# Altium footprint library Connectors.PcbLib: 135 footprints (part 3 of 9)
Each footprint in its own frame and in the unit in brackets; x right, y up, seen from the top. Pads: shape width x height; smd on the part's side, far side on the other; paste and mask are expansions set on the pad; w line width, h text height; cw(c..) or ccw(c..) is an arc to the next point about the centre after c.
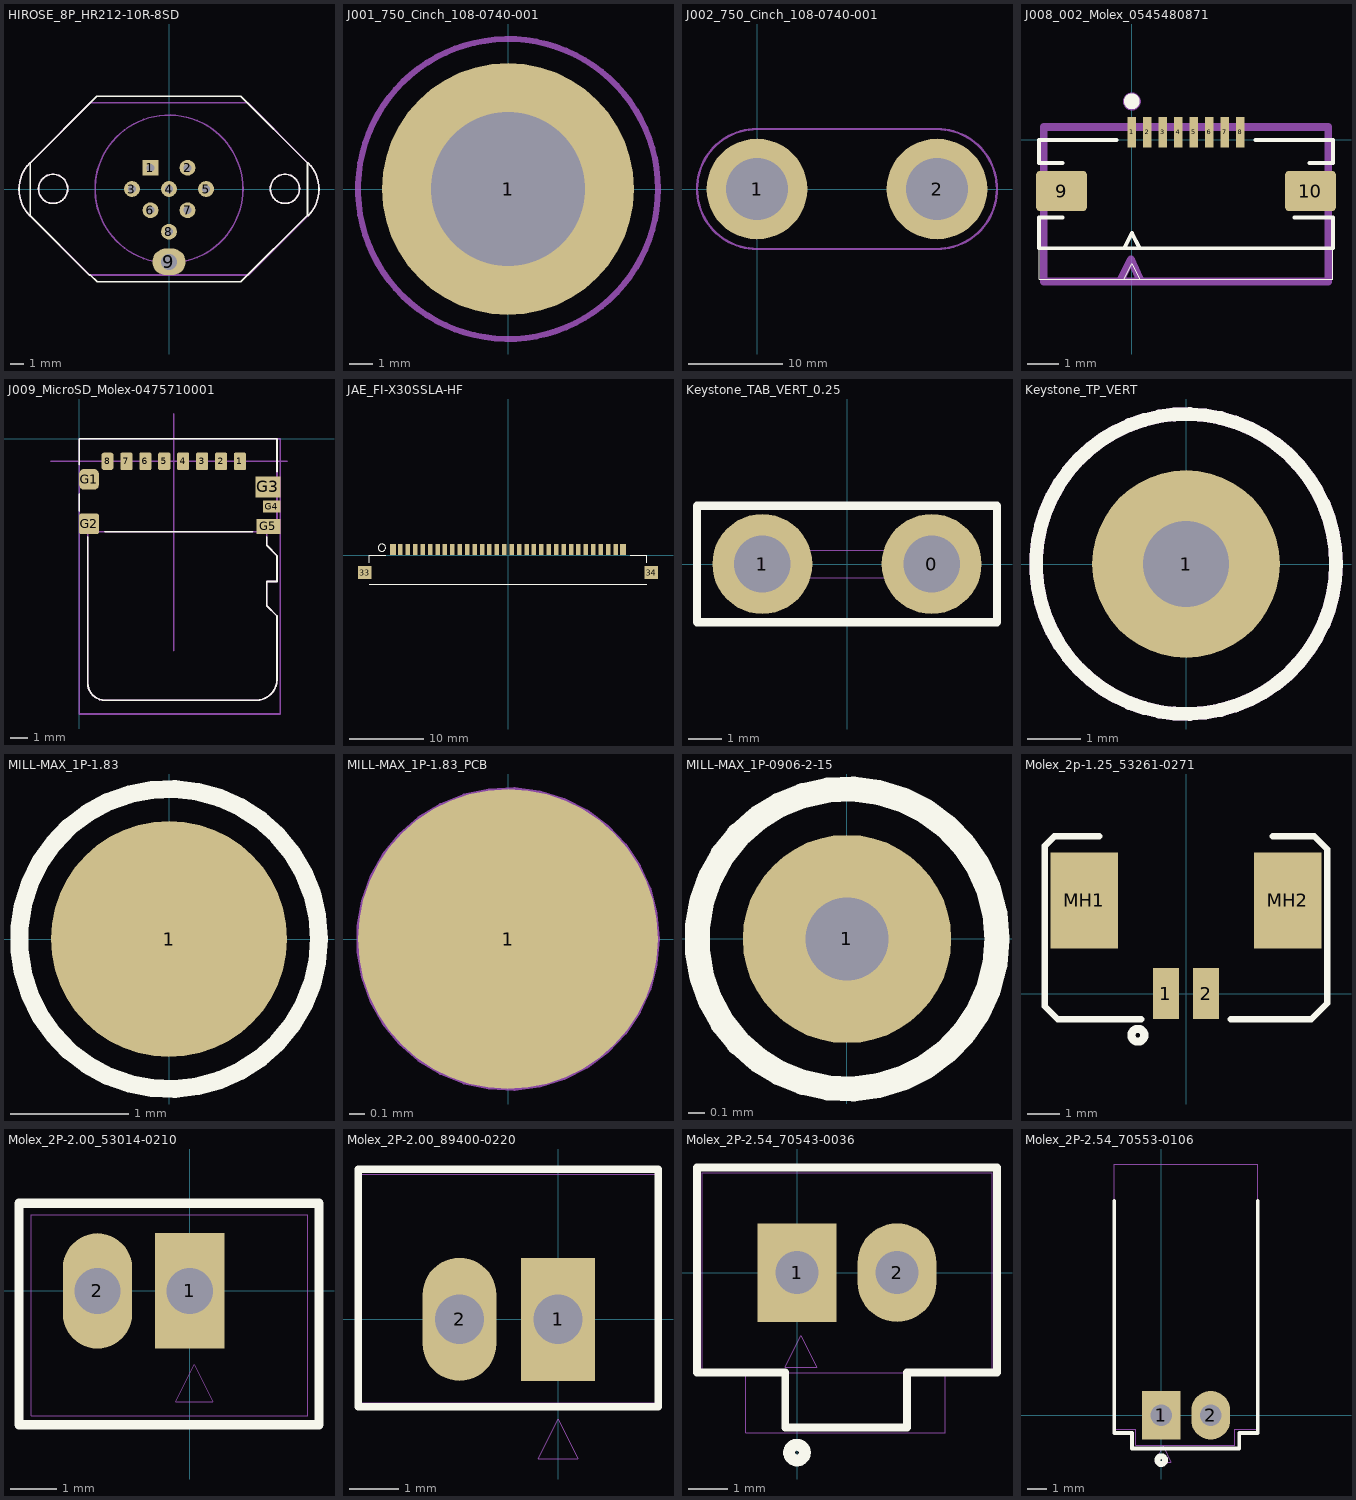
[diagram p2: the footprints below, top view; thin cyan lines are the x and y axes]

## HIROSE_8P_HR212-10R-8SD [mm] "Connector Receptacle mini-din 10 shell 8 position"
height 15.7
pads (9):
  rect 1.2x1.2 hole 0.6: 1(-1.4,1.6)
  round 1.2 hole 0.6: 2(1.4,1.6) 3(-2.794,0) 4(0,0) 5(2.8,0) 6(-1.4,-1.6) 7(1.4,-1.6) 8(0,-3.223)
  oval 2.5x2 hole 1.2: 9(0,-5.5)
Top Overlay:
  circle w0.127: c-8.749,0.012 r1.1
  circle w0.127: c8.751,0.012 r1.1
  lines w0.127: -10.496,-2.011 cw(c-8.507,-0.021) -10.496,1.968 ; 10.496,-2.011 ccw(c8.507,-0.021) 10.496,1.968 ; -10.482,-2.01 -6.007,-6.485 -5.937,-6.485 -5.422,-7 5.415,-7 10.447,-1.969 10.447,1.968 5.414,7 -5.45,7 -10.482,1.968 -10.482,-2.01
Mechanical 1:
  circle w0.127: c0,0 r5.579
  circle w0.127: c-1.399,1.612 r0.3
  circle w0.127: c-2.799,0.012 r0.3
  circle w0.127: c-1.399,-1.588 r0.3
  circle w0.127: c0.001,-5.488 r0.55
  circle w0.127: c0.001,-3.188 r0.3
  circle w0.127: c0.001,0.012 r0.3
  circle w0.127: c1.401,-1.588 r0.3
  circle w0.127: c2.801,0.012 r0.3
  circle w0.127: c1.401,1.612 r0.3
  circle w0.127: c8.751,0.012 r1.1
  circle w0.127: c-8.749,0.012 r1.1
  lines w0.127: -10.496,-2.011 cw(c-8.507,-0.021) -10.496,1.968 -10.469,1.968 -5.936,6.501 ; -10.49,-2.012 -6.024,-6.478 ; -6.014,-6.488 6.024,-6.488 ; -5.925,6.512 5.925,6.512 ; 5.936,6.501 10.469,1.968 ; 6.024,-6.478 10.49,-2.012 ; 10.496,-2.011 ccw(c8.507,-0.021) 10.496,1.968
  text ".Designator" at -0.6,2.9 h1.52
  text "1" at -2.54,2.032 h1
  text "9" at 1.404,-4.858 h1
3D body "HR212-10R-8SD.stp": height 12.7, standoff -3, extent -11.25,-6.521 11.25,6.479

## J001_750_Cinch_108-0740-001 [mil] "J001_175_Cinch_Banana-Jack"
pads (1):
  round 420 hole 257: 1(0,0)
Mechanical 1:
  circle w10: c0,0 r250

## J002_750_Cinch_108-0740-001 [mil] "J002_750_Cinch_Banana-Jack"
pads (2):
  round 420 hole 257: 1(0,0) 2(750,0)
Mechanical 1:
  lines w10: 0,-250 cw(c0,0) 0,250 750,250 cw(c750,0) 750,-250 0,-250

## J008_002_Molex_0545480871 [mm] "Connector, Header, 8pos, 0.5mm pitch, Horizontal Flat Flex"
height 1.2
pads (10):
  rrect20% 0.275x1 smd mask+0.064: 1(0,0.25) 2(0.5,0.25) 3(1,0.25) 4(1.5,0.25) 5(2,0.25) 6(2.5,0.25) 7(3,0.25) 8(3.5,0.25)
  rrect20% 1.65x1.3 smd: 9(-2.275,-1.65) 10(5.775,-1.65)
Top Overlay:
  circle w0.254: c0,1.25 r0.127
  lines w0.025: -3,-3.5 -3,-4.5 6.5,-4.5 6.5,-3.5 ; -0.25,-4.5 0,-4 0.25,-4.5
  lines w0.127: -2.25,-2.5 -3,-2.5 -3,-3.5 6.5,-3.5 6.5,-2.5 5.25,-2.5 ; -2.25,-0.75 -3,-0.75 -3,0 -0.5,0 ; -0.25,-3.5 0,-3 0.25,-3.5 ; 4,0 6.5,0 6.5,-0.75 5.75,-0.75
Mechanical 1:
  circle w0.254: c0,1.245 r0.161
  lines w0.254: -0.356,-4.496 -0.025,-3.861 0.254,-4.496 ; -2.85,-4.575 6.35,-4.575 6.35,0.425 -2.85,0.425 -2.85,-4.575
3D body "545480871.stp": height 1.18, standoff -0.02, extent -2.85,-4.575 6.35,0.425

## J009_MicroSD_Molex-0475710001 [mm] "CONN MICRO SD CARD PUSH-PULL R/A"
height 2.311
pads (13):
  rrect20% 0.7x1 smd: 1(9.35,-1.31) 2(8.25,-1.31) 3(7.15,-1.31) 4(6.05,-1.31) 5(4.95,-1.31) 6(3.85,-1.31) 7(2.75,-1.31)
  rrect40% 0.7x1 smd: 8(1.65,-1.31)
  rrect50% 1.15x1.2 smd: G1(0.575,-2.36)
  rrect20% 1.15x1.2 smd: G2(0.575,-4.95)
  rect 1.45x1.2 smd: G3(10.975,-2.8)
  rect 1x0.7 smd: G4(11.2,-3.95)
  rect 1.4x0.9 smd: G5(11,-5.1)
Top Overlay:
  lines w0.1: 0,-4.2 0,-3.2 ; 0,-1.5 0,0 11.5,0 11.5,-1.9 ; 0.5,-5.7 0.5,-14.2 ccw(c1.5,-14.2) 1.5,-15.2 10.3,-15.2 ccw(c10.3,-14) 11.5,-14 11.5,-10.3 10.9,-9.7 10.9,-8.3 11.5,-8.3 11.5,-6.8 10.9,-6.2 10.9,-5.7 ; 1.5,-5.4 10.1,-5.4
Mechanical 1:
  lines w0.1: 0.5,-5.4 0.5,-14.2 ccw(c1.5,-14.2) 1.5,-15.2 10.3,-15.2 ccw(c10.3,-14) 11.5,-14 11.5,-10.3 10.9,-9.7 10.9,-8.3 11.5,-8.3 11.5,-6.8 10.9,-6.2 10.9,-5.4 ; 0,0 0,-1.6 0,-3.1 0,-4.2 0,-5.4 1.3,-5.4 10.1,-5.4 11.5,-5.4 11.5,0 5.5,0 0,0 ; 0,0 11.7,0 11.7,-16 0,-16 0,0
Mechanical 3:
  lines w0.1: -1.65,-1.31 12.1,-1.31 ; 5.5,-12.31 5.5,1.44
3D body "475710001.stp": height 2.31, standoff 0.01, extent 0.12,-5.25 11.52,0.2

## JAE_FI-X30SSLA-HF [mm] "1.0mm pitch, for interface of LCD"
pads (34):
  rect 0.8x1.5 smd: 1(-15.5,0.75) 32(15.5,0.75)
  rect 0.6x1.5 smd: 2(-14.5,0.75) 3(-13.5,0.75) 4(-12.5,0.75) 5(-11.5,0.75) 6(-10.5,0.75) 7(-9.5,0.75) 8(-8.5,0.75) 9(-7.5,0.75) 10(-6.5,0.75) 11(-5.5,0.75) 12(-4.5,0.75) 13(-3.5,0.75) 14(-2.5,0.75) 15(-1.5,0.75) 16(-0.5,0.75) 17(0.5,0.75) 18(1.5,0.75) 19(2.5,0.75) 20(3.5,0.75) 21(4.5,0.75) 22(5.5,0.75) 23(6.5,0.75) 24(7.5,0.75) 25(8.5,0.75) 26(9.5,0.75) 27(10.5,0.75) 28(11.5,0.75) 29(12.5,0.75) 30(13.5,0.75) 31(14.5,0.75)
  rect 1.8x1.8 smd: 33(-19.325,-2.35) 34(19.325,-2.35)
Top Overlay:
  circle w0.127: c-17,1 r0.5
  lines w0.127: -18.675,-3.9 0,-3.9 18.675,-3.9 ; -18.675,-1 -18.675,0 -16.5,0 ; 16.5,0 18.675,0 18.675,-1

## Keystone_TAB_VERT_0.25 [mm] "Quick Connect TAB 0.25\""
pads (2):
  round 3 hole 1.7: 0(2.54,0) 1(-2.54,0)
Top Overlay:
  lines w0.25: -4.5,-1.75 4.5,-1.75 4.5,1.75 -4.5,1.75 -4.5,-1.75
Mechanical 1:
  circle w0.025: c2.54,0 r0.354
  circle w0.025: c-2.54,0 r0.354
  lines w0.025: -3.184,-0.406 -3.184,0.406 3.166,0.406 3.166,-0.406 -3.184,-0.406
  text ".Designator" at -0.2,0.9 h1
3D body "keystone-PN1289-ST.STEP": height 14.22, standoff -3.81, extent -3.971,-1.524 3.954,1.524

## Keystone_TP_VERT [mm] "Test Plug, Vertical"
pads (1):
  round 3.5 hole 1.6: 1(0,0)
Top Overlay:
  circle w0.254: c0,0 r2.8
Mechanical 1:
  circle w0.254: c0,0 r2.8
  text ".Designator" at 0,3.5 h1.52
3D body "keystone-PN6043.STEP": height 8.24, standoff -2.89, extent -2.375,-2.369 2.375,2.381

## MILL-MAX_1P-1.83 [mm] "Pogo pin, Surface Mount, 1.83DIA base"
height 5.99
pads (1):
  round 2 smd: 1(0,0)
Top Overlay:
  circle w0.152: c0,0 r1.27
Mechanical 1:
  circle w0.025: c0,0 r0.535
  circle w0.025: c0,0 r0.915
  text ".Designator" at -0.508,1.27 h1.52
3D body "Mill-max_1p-1.83.stp": height 5.99, standoff 0, extent -1.105,-1.105 1.105,1.105

## MILL-MAX_1P-1.83_PCB [mm] "Pogo pin, Surface Mount, 1.83DIA base"
height 5.99
pads (1):
  round 2 smd paste-2: 1(0,0)
Mechanical 1:
  circle w0.025: c0,0 r1

## MILL-MAX_1P-0906-2-15 [mil] "Pogo pin, Through Hole, 0.069 x 0.020"
pads (1):
  round 50 hole 20: 1(0,0)
Top Overlay:
  circle w6: c0,0 r36
Mechanical 1:
  circle w1: c0,0 r21.06
  circle w1: c0,0 r36
  text ".Designator" at -21.74,62.83 h60
3D body "mill-max-0906-2-15-20-75-14-11-0.step": height 189, standoff -69, extent -36,-36 36,36

## Molex_2p-1.25_53261-0271 [mm] "Connector, PicoBlade header, surface mount, RA, 2 circuits, 1.25mm pitch"
height 3.4
pads (4):
  rect 0.8x1.6 smd: 1(-0.625,0) 2(0.625,0)
  rect 2.1x3 smd: MH1(-3.175,2.9) MH2(3.175,2.9)
Top Overlay:
  circle w0.254: c-1.5,-1.3 r0.2
  lines w0.2: -2.7,4.9 -4.1,4.9 -4.4,4.6 -4.4,-0.4 -4,-0.8 -1.4,-0.8 ; 1.4,-0.8 3.9,-0.8 4.4,-0.3 4.4,4.5 4,4.9 2.7,4.9
3D body "532610271.stp": height 3.4, standoff 0, extent -3.825,-0.4 3.825,4.8

## Molex_2P-2.00_53014-0210 [mm] "Connector Header 2pos 2mmp Vertical through hole"
height 6
pads (2):
  rect 1.5x2.5 hole 1: 1(0,0)
  oval 1.5x2.5 hole 1: 2(-2,0)
Top Overlay:
  lines w0.2: -3.7,-2.9 2.8,-2.9 2.8,1.9 -3.7,1.9 -3.7,-2.9
Mechanical 1:
  lines w0.025: -3.44,-2.7 2.56,-2.7 2.56,1.65 -3.44,1.65 -3.44,-2.7 ; -0.3,-2.4 0.5,-2.4 0.1,-1.6 -0.3,-2.4
  text ".Designator" at -0.9,2.4 h1.52
3D body "530140210.stp": height 5.85, standoff -3.3, extent -3.44,-2.7 2.56,1.65

## Molex_2P-2.00_89400-0220 [mm] "Connector Header 2pos 2mmp Vertical through hole"
height 6
pads (2):
  rect 1.5x2.5 hole 1: 1(0,0)
  oval 1.5x2.5 hole 1: 2(-2,0)
Top Overlay:
  lines w0.152: -4.064,-1.778 -4.064,3.048 2.032,3.048 2.032,-1.778 -4.064,-1.778
Mechanical 1:
  circle w0.025: c0,0 r0.349
  circle w0.025: c-2,0 r0.349
  lines w0.025: -4,-1.7 2,-1.7 2,2.95 -4,2.95 -4,-1.7 ; -0.4,-2.832 0,-2.032 0.4,-2.832 -0.4,-2.832
  text ".Designator" at -2.286,3.556 h1.52
3D body "894000220.stp": height 6.05, standoff -3.4, extent -4,-1.7 2,2.95

## Molex_2P-2.54_70543-0036 [mm] "Connector Header 2pos 2.54mmp vertical through hole"
height 6
pads (2):
  rect 2x2.5 hole 1.1: 1(0,0)
  oval 2x2.5 hole 1.1: 2(2.54,0)
Top Overlay:
  circle w0.3: c0,-4.572 r0.2
  lines w0.2: -2.54,2.667 -2.54,-2.54 -0.3,-2.54 -0.3,-3.937 2.794,-3.937 2.794,-2.54 5.08,-2.54 5.08,2.667
  lines w0.203: -2.54,2.667 5.08,2.667
Mechanical 1:
  circle w0.025: c0,0 r0.52
  circle w0.025: c2.54,0 r0.52
  lines w0.025: -1.305,-2.54 3.77,-2.54 ; -1.305,-2.54 -2.413,-2.54 -2.413,2.54 4.953,2.54 4.953,-2.54 3.77,-2.54 ; -1.305,-2.54 -1.305,-4.064 3.77,-4.064 3.77,-2.54 ; -0.3,-2.4 0.1,-1.6 0.5,-2.4 -0.3,-2.4
  text ".Designator" at -0.381,3.175 h1.52
3D body "705430036.stp": height 11.81, standoff -3.3, extent -2.413,-4.064 4.953,2.54

## Molex_2P-2.54_70553-0106 [mm] "Connector Header 2pos 2.54mmp right angle through hole"
height 6
pads (2):
  rect 2x2.5 hole 1.1: 1(0,0)
  oval 2x2.5 hole 1.1: 2(2.54,0)
Top Overlay:
  circle w0.3: c0,-2.3 r0.2
  lines w0.2: -2.413,11 -2.413,-0.9 -1.5,-0.9 -1.5,-1.7 4,-1.7 4,-0.9 4.953,-0.9 4.953,11
Mechanical 1:
  circle w0.025: c0,0 r0.52
  circle w0.025: c2.54,0 r0.52
  lines w0.025: -2.413,-0.705 -2.413,12.895 4.953,12.895 4.953,-0.705 3.77,-0.705 3.77,-1.53 -1.305,-1.53 -1.305,-0.705 -2.413,-0.705 ; -0.3,-2.4 0.1,-1.6 0.5,-2.4 -0.3,-2.4
  text ".Designator" at -0.98,5.57 h1.52
3D body "705530106.stp": height 6.98, standoff -3.3, extent -2.413,-0.698 4.953,12.891